# Altium footprint library lib_protel_HC_BOINA.PCBLIB: 726 footprints (part 13 of 46)
Each footprint in its own frame and in the unit in brackets; x right, y up, seen from the top. Pads: shape width x height; smd on the part's side, far side on the other; paste and mask are expansions set on the pad; w line width, h text height; cw(c..) or ccw(c..) is an arc to the next point about the centre after c.
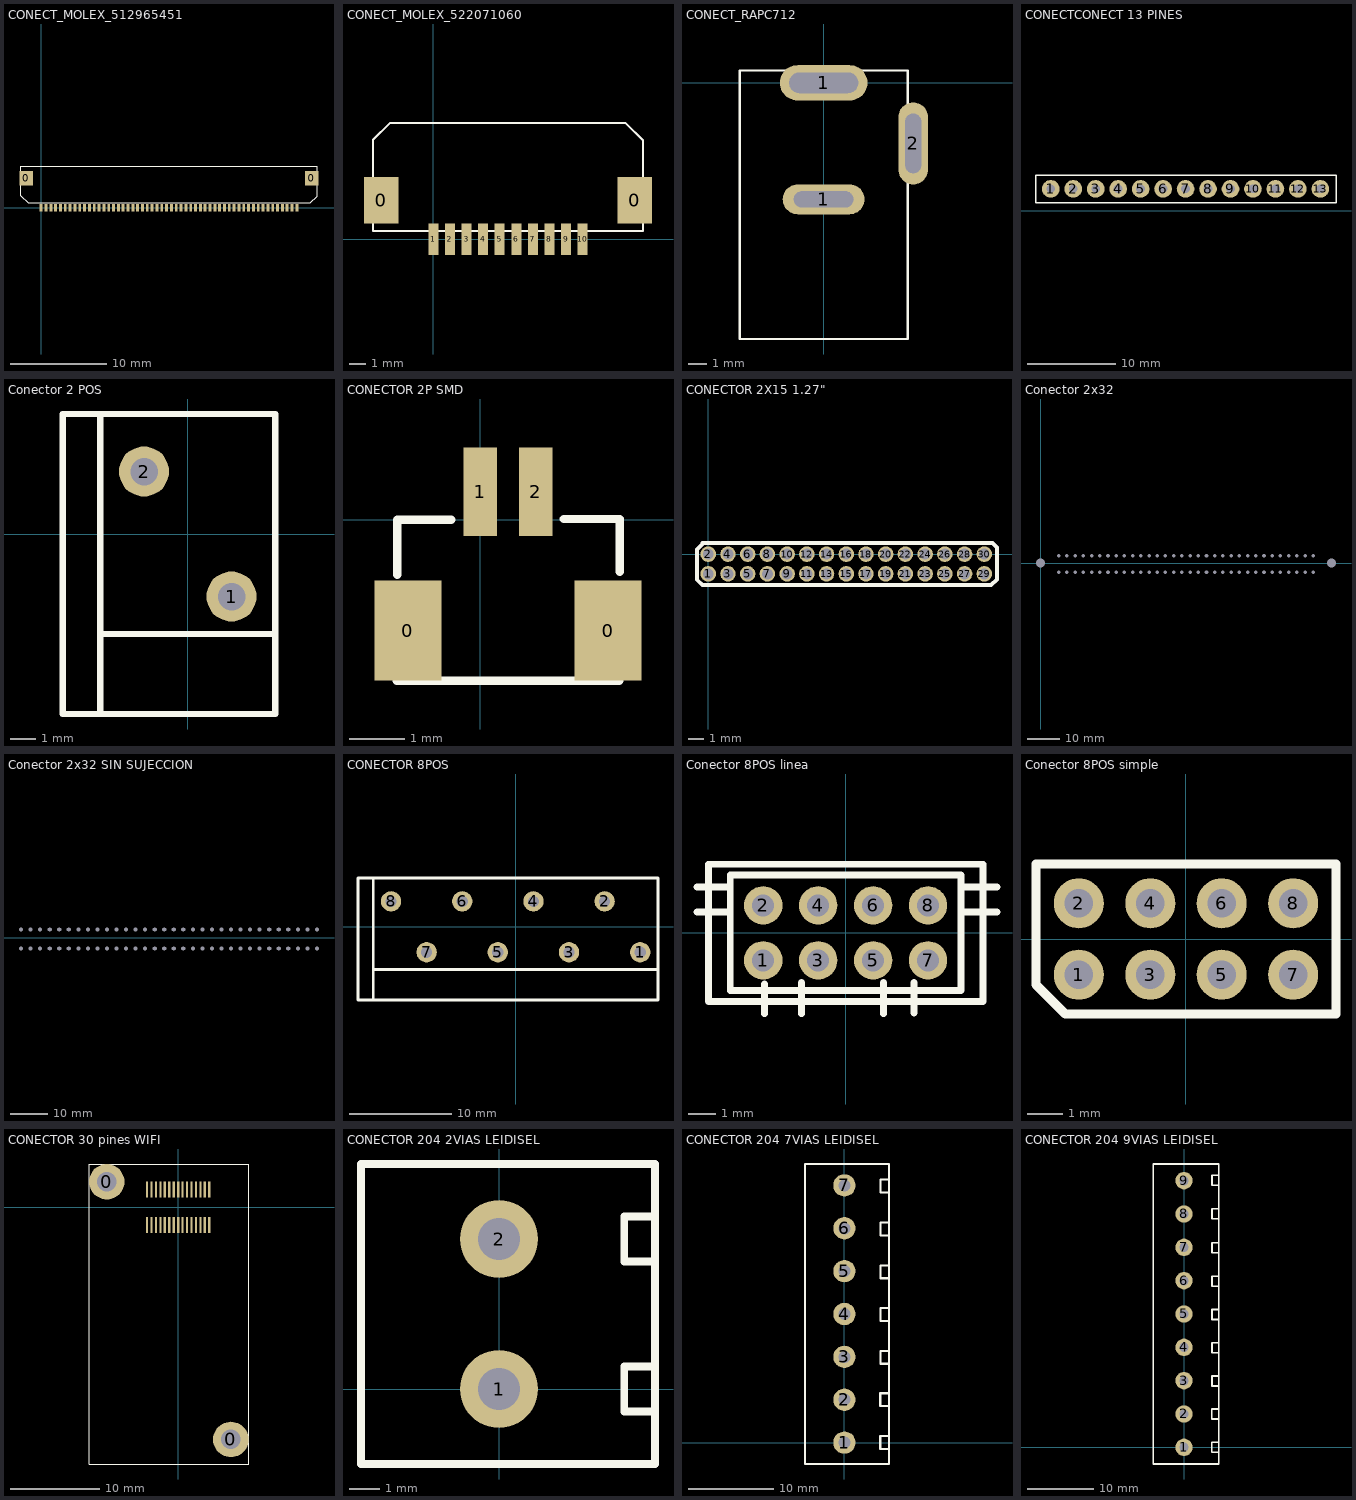
[diagram p12: the footprints below, top view; thin cyan lines are the x and y axes]

## CONECT_MOLEX_512965451 [mm] "CONECTOR DE MOLEX PARA PANTALLA TACTIL"
height 1.3
pads (56):
  rect 1.4x1.5 smd: 0(-1.55,3.05) 0(28.05,3.05)
  rect 0.3x0.8 smd: 1(0,0) 2(0.5,0) 3(1,0) 4(1.5,0) 5(2,0) 6(2.5,0) 7(3,0) 8(3.5,0) 9(4,0) 10(4.5,0) 11(5,0) 12(5.5,0) 13(6,0) 14(6.5,0) 15(7,0) 16(7.5,0) 17(8,0) 18(8.5,0) 19(9,0) 20(9.5,0) 21(10,0) 22(10.5,0) 23(11,0) 24(11.5,0) 25(12,0) 26(12.5,0) 27(13,0) 28(13.5,0) 29(14,0) 30(14.5,0) 31(15,0) 32(15.5,0) 33(16,0) 34(16.5,0) 35(17,0) 36(17.5,0) 37(18,0) 38(18.5,0) 39(19,0) 40(19.5,0) 41(20,0) 42(20.5,0) 43(21,0) 44(21.5,0) 45(22,0) 46(22.5,0) 47(23,0) 48(23.5,0) 49(24,0) 50(24.5,0) 51(25,0) 52(25.5,0) 53(26,0) 54(26.5,0)
Top Overlay:
  lines w0.127: -2.1,1.26 -2.1,4.3 28.6,4.3 28.6,1.21 27.89,0.5 -1.34,0.5 -2.1,1.26

## CONECT_MOLEX_522071060 [mm] "CONECTOR DE MOLEX PARA PANTALLA TACTIL"
height 2.7
pads (12):
  rect 2.1x2.8 smd: 0(-3.15,2.35) 0(12.15,2.35)
  rect 0.6x1.9 smd: 1(0,0) 2(1,0) 3(2,0) 4(3,0) 5(4,0) 6(5,0) 7(6,0) 8(7,0) 9(8,0) 10(9,0)
Top Overlay:
  lines w0.127: -3.65,0.5 -3.65,5.98 -2.63,7 11.6,7 12.65,5.95 12.65,0.5 -3.65,0.5

## CONECT_RAPC712 [mm] "CONECTOR ALIMETACIÓN 5.5MM"
height 11
pads (3):
  oval 4.4x1.6 hole 0.85 slot 3.2 at 0 deg: 1(0,-6.25)
  oval 4.7x1.9 hole 1.1 slot 3.7 at 0 deg: 1(0,0)
  oval 1.6x4.4 hole 0.85 slot 3.2 at 90 deg: 2(4.8,-3.25)
Top Overlay:
  lines w0.127: -4.5,-13.74 -4.5,0.66 4.5,0.66 4.5,-13.74 -4.5,-13.74

## CONECTCONECT 13 PINES [mm]
pads (13):
  round 2 hole 1: 1(4.84,2.46) 2(7.38,2.46) 3(9.92,2.46) 4(12.46,2.46) 5(15,2.46) 6(17.54,2.46) 7(20.08,2.46) 8(22.62,2.46) 9(25.16,2.46) 10(27.7,2.46) 11(30.24,2.46) 12(32.78,2.46) 13(35.32,2.46)
Top Overlay:
  lines w0.152: 3.23,0.9 3.18,0.9 3.17,0.91 3.17,3.98 37.09,3.98 37.09,3.86 37.09,0.9 3.24,0.9

## Conector 2 POS [mm]
pads (2):
  round 2 hole 1.1: 1(1.75,-2.5) 2(-1.75,2.5)
Top Overlay:
  lines w0.254: -3.5,-4 3.5,-4 ; -3.5,-7.2 -3.5,4.8 ; -3.5,-7.2 3.5,-7.2 3.5,4.8 -3.5,4.8 ; -3.5,-7.2 -5,-7.2 -5,4.8 -3.5,4.8

## CONECTOR 2P SMD [mm] "CONECTOR 2P PITCH 1mm en SMD."
height 4.25
pads (4):
  rect 1.2x1.8 smd: 0(-1.3,-2) 0(2.3,-2)
  rect 0.6x1.6 smd: 1(0,0.5) 2(1,0.5)
Top Overlay:
  lines w0.152: -1.5,-2.9 2.5,-2.9 ; -1.49,-0.99 -1.49,-0.01 ; -1.49,0 -0.52,0 ; 1.5,0.01 2.5,0.01 ; 2.51,-0.94 2.51,0.01

## CONECTOR 2X15 1.27" [mm]
pads (30):
  round 1 hole 0.7 paste+0 mask+0.1: 1(0,-1.27) 3(1.27,-1.27) 4(1.27,0) 5(2.54,-1.27) 6(2.54,0) 7(3.81,-1.27) 8(3.81,0) 9(5.08,-1.27) 10(5.08,0) 11(6.35,-1.27) 12(6.35,0) 13(7.62,-1.27) 14(7.62,0) 15(8.89,-1.27) 16(8.89,0) 17(10.16,-1.27) 18(10.16,0) 19(11.43,-1.27) 20(11.43,0) 21(12.7,-1.27) 22(12.7,0) 23(13.97,-1.27) 24(13.97,0) 25(15.24,-1.27) 26(15.24,0) 27(16.51,-1.27) 28(16.51,0) 29(17.78,-1.27) 30(17.78,0)
  round 1 hole 0.7 paste+0.2 mask+0.1: 2(0,0)
Top Overlay:
  lines w0.254: -0.375,0.725 18.3,0.725 18.6,0.425 18.6,-1.625 18.225,-2 -0.375,-2 -0.725,-1.65 -0.725,0.3 -0.3,0.725 ; -0.3,0.725 -0.3,0.725

## Conector 2x32 [mm]
height 11.6
pads (66):
  round 0 hole 2.8 unplated: 0(0,0) 0(90,0)
  round 0 hole 1.1 unplated: 1(5.63,2.24) 2(8.17,2.24) 3(10.71,2.24) 4(13.25,2.24) 5(15.79,2.24) 6(18.33,2.24) 7(20.87,2.24) 8(23.41,2.24) 9(25.95,2.24) 10(28.49,2.24) 11(31.03,2.24) 12(33.57,2.24) 13(36.11,2.24) 14(38.65,2.24) 15(41.19,2.24) 16(43.73,2.24) 17(46.27,2.24) 18(48.81,2.24) 19(51.35,2.24) 20(53.89,2.24) 21(56.43,2.24) 22(58.97,2.24) 23(61.51,2.24) 24(64.05,2.24) 25(66.59,2.24) 26(69.13,2.24) 27(71.67,2.24) 28(74.21,2.24) 29(76.75,2.24) 30(79.29,2.24) 31(81.83,2.24) 32(84.37,2.24) 33(84.37,-2.84) 34(81.83,-2.84) 35(79.29,-2.84) 36(76.75,-2.84) 37(74.21,-2.84) 38(71.67,-2.84) 39(69.13,-2.84) 40(66.59,-2.84) 41(64.05,-2.84) 42(61.51,-2.84) 43(58.97,-2.84) 44(56.43,-2.84) 45(53.89,-2.84) 46(51.35,-2.84) 47(48.81,-2.84) 48(46.27,-2.84) 49(43.73,-2.84) 50(41.19,-2.84) 51(38.65,-2.84) 52(36.11,-2.84) 53(33.57,-2.84) 54(31.03,-2.84) 55(28.49,-2.84) 56(25.95,-2.84) 57(23.41,-2.84) 58(20.87,-2.84) 59(18.33,-2.84) 60(15.79,-2.84) 61(13.25,-2.84) 62(10.71,-2.84) 63(8.17,-2.84) 64(5.63,-2.84)

## Conector 2x32 SIN SUJECCION [mm]
height 11.6
pads (64):
  round 0 hole 1.1 unplated: 1(5.63,2.24) 2(8.17,2.24) 3(10.71,2.24) 4(13.25,2.24) 5(15.79,2.24) 6(18.33,2.24) 7(20.87,2.24) 8(23.41,2.24) 9(25.95,2.24) 10(28.49,2.24) 11(31.03,2.24) 12(33.57,2.24) 13(36.11,2.24) 14(38.65,2.24) 15(41.19,2.24) 16(43.73,2.24) 17(46.27,2.24) 18(48.81,2.24) 19(51.35,2.24) 20(53.89,2.24) 21(56.43,2.24) 22(58.97,2.24) 23(61.51,2.24) 24(64.05,2.24) 25(66.59,2.24) 26(69.13,2.24) 27(71.67,2.24) 28(74.21,2.24) 29(76.75,2.24) 30(79.29,2.24) 31(81.83,2.24) 32(84.37,2.24) 33(84.37,-2.84) 34(81.83,-2.84) 35(79.29,-2.84) 36(76.75,-2.84) 37(74.21,-2.84) 38(71.67,-2.84) 39(69.13,-2.84) 40(66.59,-2.84) 41(64.05,-2.84) 42(61.51,-2.84) 43(58.97,-2.84) 44(56.43,-2.84) 45(53.89,-2.84) 46(51.35,-2.84) 47(48.81,-2.84) 48(46.27,-2.84) 49(43.73,-2.84) 50(41.19,-2.84) 51(38.65,-2.84) 52(36.11,-2.84) 53(33.57,-2.84) 54(31.03,-2.84) 55(28.49,-2.84) 56(25.95,-2.84) 57(23.41,-2.84) 58(20.87,-2.84) 59(18.33,-2.84) 60(15.79,-2.84) 61(13.25,-2.84) 62(10.71,-2.84) 63(8.17,-2.84) 64(5.63,-2.84)

## CONECTOR 8POS [mm]
pads (8):
  round 2 hole 1.1: 1(12.25,-2.5) 2(8.75,2.5) 3(5.25,-2.5) 4(1.75,2.5) 5(-1.75,-2.5) 6(-5.25,2.5) 7(-8.75,-2.5) 8(-12.25,2.5)
Top Overlay:
  lines w0.254: -14,-4.2 14,-4.2 ; -14,-7.2 -15.5,-7.2 -15.5,4.8 -14,4.8 ; -14,-7.2 -14,4.8 ; -14,-7.2 14,-7.2 14,4.8 -14,4.8

## Conector 8POS linea [mm]
pads (8):
  round 1.4 hole 0.8: 1(-3,-1) 2(-3,1) 3(-1,-1) 4(-1,1) 5(1,-1) 6(1,1) 7(3,-1) 8(3,1)
Top Overlay:
  lines w0.254: -5.41,0.762 -4.225,0.762 ; -5.41,1.676 -4.225,1.676 ; -2.946,-2.944 -2.946,-1.854 ; -1.6,-2.944 -1.6,-1.803 ; 1.372,-2.944 1.372,-1.803 ; 2.489,-2.918 2.489,-1.803 ; 4.2,0.762 5.512,0.762 ; 4.2,1.676 5.512,1.676 ; -5,-2.5 -5,2.5 5,2.5 5,-2.5 -5,-2.5 ; -4.2,-2.1 -4.2,2.1 4.2,2.1 4.2,-2.1 -4.2,-2.1

## Conector 8POS simple [mm] "tira pines"
height 3.5
pads (8):
  round 1.4 hole 0.8: 1(-3,-1) 2(-3,1) 3(-1,-1) 4(-1,1) 5(1,-1) 6(1,1) 7(3,-1) 8(3,1)
Top Overlay:
  lines w0.254: -4.2,-1.275 -3.375,-2.1 4.2,-2.1 4.2,2.1 -4.2,2.1 -4.2,-1.275

## CONECTOR 30 pines WIFI [mm] "Conector para Nano WiReach"
height 2.27
pads (32):
  round 4 hole 2.2: 0(-8.03,2.85) 0(5.93,-26.15)
  rect 0.25x1.8 smd: 1(-3.5,-2) 2(-3.5,2) 3(-3,-2) 4(-3,2) 5(-2.5,-2) 6(-2.5,2) 7(-2,-2) 8(-2,2) 9(-1.5,-2) 10(-1.5,2) 11(-1,-2) 12(-1,2) 13(-0.5,-2) 14(-0.5,2) 15(0,-2) 16(0,2) 17(0.5,-2) 18(0.5,2) 19(1,-2) 20(1,2) 21(1.5,-2) 22(1.5,2) 23(2,-2) 24(2,2) 25(2.5,-2) 26(2.5,2) 27(3,-2) 28(3,2) 29(3.5,-2) 30(3.5,2)
Top Overlay:
  lines w0.127: -10.03,-28.91 -10.03,4.85 7.97,4.85 7.97,-28.91 -10.03,-28.91
3D body "529910308.stp": height 2.27, standoff -0.03, extent -5.65,-2.7 5.65,2.7

## CONECTOR 204 2VIAS LEIDISEL [mm]
height 16.5
pads (2):
  round 2.6 hole 1.4: 1(0,0) 2(0,5)
Top Overlay:
  lines w0.254: 5.173,-0.75 4.173,-0.75 4.173,0.75 5.173,0.75 ; 5.173,4.25 4.173,4.25 4.173,5.75 5.173,5.75 ; -4.6,-2.5 -4.6,7.5 5.2,7.5 5.2,-2.5 -4.6,-2.5

## CONECTOR 204 7VIAS LEIDISEL [mm]
height 16.5
pads (7):
  round 2.6 hole 1.4: 1(0,0) 2(0,5) 3(0,10) 4(0,15) 5(0,20) 6(0,25) 7(0,30)
Top Overlay:
  lines w0.254: -4.6,-2.5 5.2,-2.5 5.2,32.5 -4.6,32.5 ; 5.173,-0.75 4.173,-0.75 4.173,0.75 5.173,0.75 ; 5.173,4.25 4.173,4.25 4.173,5.75 5.173,5.75 ; 5.2,9.198 4.2,9.198 4.2,10.698 5.2,10.698 ; 5.2,14.198 4.2,14.198 4.2,15.698 5.2,15.698 ; 5.2,19.166 4.2,19.166 4.2,20.666 5.2,20.666 ; 5.2,24.166 4.2,24.166 4.2,25.666 5.2,25.666 ; 5.2,29.173 4.2,29.173 4.2,30.673 5.2,30.673
  lines w0.255: -4.6,-2.5 -4.6,32.5

## CONECTOR 204 9VIAS LEIDISEL [mm]
height 16.5
pads (9):
  round 2.6 hole 1.4: 1(0,0) 2(0,5) 3(0,10) 4(0,15) 5(0,20) 6(0,25) 7(0,30) 8(0,35) 9(0,40)
Top Overlay:
  lines w0.254: 5.173,-0.75 4.173,-0.75 4.173,0.75 5.173,0.75 ; 5.173,4.25 4.173,4.25 4.173,5.75 5.173,5.75 ; 5.2,9.198 4.2,9.198 4.2,10.698 5.2,10.698 ; 5.2,14.198 4.2,14.198 4.2,15.698 5.2,15.698 ; 5.2,19.166 4.2,19.166 4.2,20.666 5.2,20.666 ; 5.2,24.166 4.2,24.166 4.2,25.666 5.2,25.666 ; 5.2,29.173 4.2,29.173 4.2,30.673 5.2,30.673 ; 5.2,34.285 4.2,34.285 4.2,35.785 5.2,35.785 ; 5.2,39.292 4.2,39.292 4.2,40.792 5.2,40.792 ; -4.6,-2.5 5.2,-2.5 5.2,42.5 -4.6,42.5 -4.6,-2.5